# Altium footprint library Custom_Library.PcbLib: 221 footprints (part 9 of 14)
Each footprint in its own frame and in the unit in brackets; x right, y up, seen from the top. Pads: shape width x height; smd on the part's side, far side on the other; paste and mask are expansions set on the pad; w line width, h text height; cw(c..) or ccw(c..) is an arc to the next point about the centre after c.
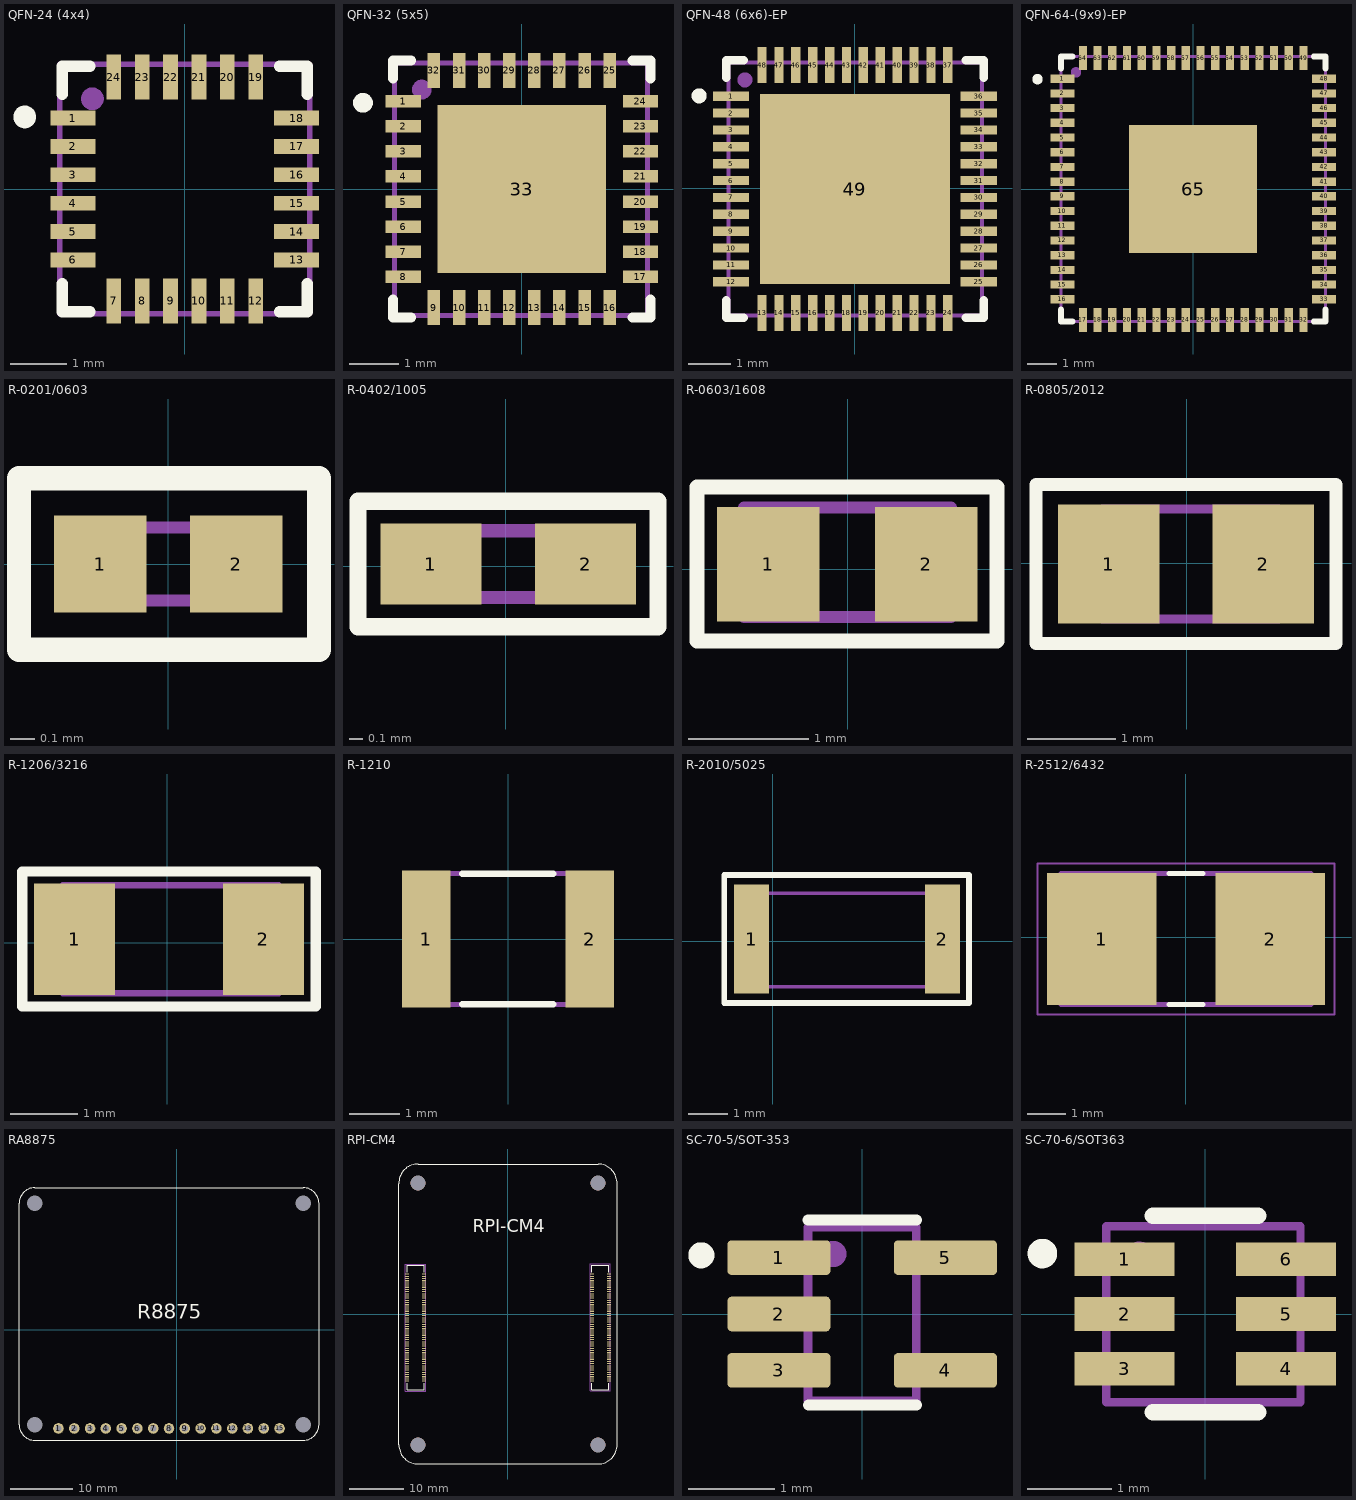
[diagram p8: the footprints below, top view; thin cyan lines are the x and y axes]

## QFN-24 (4x4) [mm]
pads (24):
  rect 0.79x0.26 smd: 1(-1.97,1.25) 2(-1.97,0.75) 3(-1.97,0.25) 4(-1.97,-0.25) 5(-1.97,-0.75) 6(-1.97,-1.25) 13(1.97,-1.25) 14(1.97,-0.75) 15(1.97,-0.25) 16(1.97,0.25) 17(1.97,0.75) 18(1.97,1.25)
  rect 0.26x0.79 smd: 7(-1.25,-1.97) 8(-0.75,-1.97) 9(-0.25,-1.97) 10(0.25,-1.97) 11(0.75,-1.97) 12(1.25,-1.97) 19(1.25,1.97) 20(0.75,1.97) 21(0.25,1.97) 22(-0.25,1.97) 23(-0.75,1.97) 24(-1.25,1.97)
Top Overlay:
  circle w0.2: c-2.819,1.27 r0.1
  lines w0.2: -2.159,-1.669 -2.159,-2.159 -1.669,-2.159 ; -2.159,1.669 -2.159,2.159 -1.669,2.159 ; 1.669,-2.159 2.159,-2.159 2.159,-1.669 ; 1.669,2.159 2.159,2.159 2.159,1.669
Top Assembly:
  circle w0.2: c-1.626,1.589 r0.1
  lines w0.1: -2.2,-2.2 -2.2,2.2 2.2,2.2 2.2,-2.2 -2.2,-2.2
  text "'.Designator'" at -3,-3.649 h1.27

## QFN-32 (5x5) [mil]
pads (33):
  rect 28x10 smd: 1(-94.5,70) 2(-94.5,50) 3(-94.5,30) 4(-94.5,10) 5(-94.5,-10) 6(-94.5,-30) 7(-94.5,-50) 8(-94.5,-70) 17(94.5,-70) 18(94.5,-50) 19(94.5,-30) 20(94.5,-10) 21(94.5,10) 22(94.5,30) 23(94.5,50) 24(94.5,70)
  rect 10x28 smd: 9(-70,-94.5) 10(-50,-94.5) 11(-30,-94.5) 12(-10,-94.5) 13(10,-94.5) 14(30,-94.5) 15(50,-94.5) 16(70,-94.5) 25(70,94.5) 26(50,94.5) 27(30,94.5) 28(10,94.5) 29(-10,94.5) 30(-30,94.5) 31(-50,94.5) 32(-70,94.5)
  rect 134x134 smd: 33(0,0)
Top Overlay:
  circle w7.87: c-126.56,68.63 r3.94
  lines w7.87: -102.5,-88.1 -102.5,-102.5 -88.1,-102.5 ; -102.5,88.1 -102.5,102.5 -88.1,102.5 ; 88.1,-102.5 102.5,-102.5 102.5,-88.1 ; 88.1,102.5 102.5,102.5 102.5,88.1
Top Paste:
  drawing of 25 lines, arcs and shapes, not listed
Top Solder:
  region: -69.5,54.37 -69.5,69.5 69.5,69.5 69.5,54.37
  region: -69.5,23.37 -69.5,38.63 69.5,38.63 69.5,23.37
  region: -69.5,-7.63 -69.5,7.63 69.5,7.63 69.5,-7.63
  region: -69.5,-38.63 -69.5,-23.37 69.5,-23.37 69.5,-38.63
  region: -69.5,-69.5 -69.5,-54.37 69.5,-54.37 69.5,-69.5
  region: -69.5,-69.5 -69.5,69.5 -54.37,69.5 -54.37,-69.5
  region: -23.37,-69.5 -23.37,69.5 -38.63,69.5 -38.63,-69.5
  region: 7.63,-69.5 7.63,69.5 -7.63,69.5 -7.63,-69.5
  region: 38.63,-69.5 38.63,69.5 23.37,69.5 23.37,-69.5
  region: 54.37,-69.5 54.37,69.5 69.5,69.5 69.5,-69.5
Top Assembly:
  circle w7.87: c-79.65,79.2 r3.94
  lines w3.94: -101.44,-100.63 100.04,-100.63 100.04,100.5 -81.44,100.5 -101.44,100.5 -101.44,-100.63
  text "'.Designator'" at -143.69,-169.24 h50
3D body: height 10, standoff 0, extent 0,0 10,10
3D body "QFN32_5X5MC_MCH.step": height 55.12, standoff 0, extent -100.51,-100.51 100.51,100.51

## QFN-48 (6x6)-EP [mm]
pads (49):
  rect 0.86x0.22 smd: 1(-2.936,2.183) 2(-2.936,1.783) 3(-2.936,1.383) 4(-2.936,0.983) 5(-2.936,0.583) 6(-2.936,0.183) 7(-2.936,-0.217) 8(-2.936,-0.617) 9(-2.936,-1.017) 10(-2.936,-1.417) 11(-2.936,-1.817) 12(-2.936,-2.217) 25(2.934,-2.217) 26(2.934,-1.817) 27(2.934,-1.417) 28(2.934,-1.017) 29(2.934,-0.617) 30(2.934,-0.217) 31(2.934,0.183) 32(2.934,0.583) 33(2.934,0.983) 34(2.934,1.383) 35(2.934,1.783) 36(2.934,2.183)
  rect 0.22x0.86 smd: 13(-2.201,-2.952) 14(-1.801,-2.952) 15(-1.401,-2.952) 16(-1.001,-2.952) 17(-0.601,-2.952) 18(-0.201,-2.952) 19(0.199,-2.952) 20(0.599,-2.952) 21(0.999,-2.952) 22(1.399,-2.952) 23(1.799,-2.952) 24(2.199,-2.952) 37(2.199,2.918) 38(1.799,2.918) 39(1.399,2.918) 40(0.999,2.918) 41(0.599,2.918) 42(0.199,2.918) 43(-0.201,2.918) 44(-0.601,2.918) 45(-1.001,2.918) 46(-1.401,2.918) 47(-1.801,2.918) 48(-2.201,2.918)
  rect 4.5x4.5 smd paste-3 mask+0.102: 49(-0.001,-0.017)
Top Overlay:
  circle w0.254: c-3.693,2.189 r0.049
  lines w0.2: -3.051,-2.647 -3.051,-3.067 -2.631,-3.067 ; -3.051,2.613 -3.051,3.033 -2.631,3.033 ; 2.629,-3.067 3.049,-3.067 3.049,-2.647 ; 2.629,3.033 3.049,3.033 3.049,2.613
Top Paste:
  region: 1.879,-1.897 0.419,-1.897 0.419,-0.437 1.879,-0.437
  region: -0.421,-1.897 -1.881,-1.897 -1.881,-0.437 -0.421,-0.437
  region: 1.879,0.403 0.419,0.403 0.419,1.863 1.879,1.863
  region: -0.421,0.403 -1.881,0.403 -1.881,1.863 -0.421,1.863
Top Assembly:
  circle w0.254: c-2.606,2.567 r0.049
  lines w0.1: -2.997,-3.016 2.44,-3.016 3.006,-3.016 3.006,1.461 3.006,2.98 -2.473,2.98 -2.997,2.98 -2.997,-0.61 -2.997,-3.016
  text "'.Designator'" at -3.037,-4.648 h1.27
3D body "P9242-RNDGI8.STEP": height 0.95, standoff -0.05, extent -3.001,-3.017 2.999,2.983

## QFN-64-(9x9)-EP [mm]
pads (65):
  rect 0.81x0.28 smd: 1(-4.45,3.75) 2(-4.45,3.25) 3(-4.45,2.75) 4(-4.45,2.25) 5(-4.45,1.75) 6(-4.45,1.25) 7(-4.45,0.75) 8(-4.45,0.25) 9(-4.45,-0.25) 10(-4.45,-0.75) 11(-4.45,-1.25) 12(-4.45,-1.75) 13(-4.45,-2.25) 14(-4.45,-2.75) 15(-4.45,-3.25) 16(-4.45,-3.75) 33(4.45,-3.75) 34(4.45,-3.25) 35(4.45,-2.75) 36(4.45,-2.25) 37(4.45,-1.75) 38(4.45,-1.25) 39(4.45,-0.75) 40(4.45,-0.25) 41(4.45,0.25) 42(4.45,0.75) 43(4.45,1.25) 44(4.45,1.75) 45(4.45,2.25) 46(4.45,2.75) 47(4.45,3.25) 48(4.45,3.75)
  rect 0.28x0.81 smd: 17(-3.75,-4.45) 18(-3.25,-4.45) 19(-2.75,-4.45) 20(-2.25,-4.45) 21(-1.75,-4.45) 22(-1.25,-4.45) 23(-0.75,-4.45) 24(-0.25,-4.45) 25(0.25,-4.45) 26(0.75,-4.45) 27(1.25,-4.45) 28(1.75,-4.45) 29(2.25,-4.45) 30(2.75,-4.45) 31(3.25,-4.45) 32(3.75,-4.45) 49(3.75,4.45) 50(3.25,4.45) 51(2.75,4.45) 52(2.25,4.45) 53(1.75,4.45) 54(1.25,4.45) 55(0.75,4.45) 56(0.25,4.45) 57(-0.25,4.45) 58(-0.75,4.45) 59(-1.25,4.45) 60(-1.75,4.45) 61(-2.25,4.45) 62(-2.75,4.45) 63(-3.25,4.45) 64(-3.75,4.45)
  rect 4.35x4.35 smd paste-3: 65(0,0)
Top Overlay:
  circle w0.254: c-5.296,3.734 r0.049
  lines w0.2: -4.5,-4.1 -4.5,-4.5 -4.1,-4.5 ; -4.5,4.1 -4.5,4.5 -4.1,4.5 ; 4.1,-4.5 4.5,-4.5 4.5,-4.1 ; 4.1,4.5 4.5,4.5 4.5,4.1
Top Paste:
  region: 1.375,-1.375 -1.375,-1.375 -1.375,1.375 1.375,1.375
Top Assembly:
  circle w0.254: c-3.986,3.966 r0.049
  lines w0.1: -4.5,-4.5 -4.5,4.5 4.5,4.5 4.5,-4.5 -4.5,-4.5
  text "'.Designator'" at -3.305,-6.268 h1.27
3D body "QFN_32HQ-REEL_FTD.step": height 0.89, standoff 0, extent -4.496,-4.496 4.496,4.496

## R-0201/0603 [mm]
pads (2):
  rect 0.38x0.4 smd: 1(-0.28,0) 2(0.28,0)
Top Overlay:
  lines w0.1: -0.614,-0.353 0.621,-0.353 0.621,0.353 -0.614,0.353 -0.614,-0.353
Top Assembly:
  lines w0.05: -0.302,-0.151 0.3,-0.151 0.3,0.151 -0.302,0.151 -0.302,-0.151
  text "'.Designator'" at -3.161,-1.371 h1.27
3D body "R0201_020.STEP": height 0.2, standoff 0, extent -0.295,-0.148 0.305,0.152

## R-0402/1005 [mm]
height 1.3
pads (2):
  rect 0.75x0.6 smd: 1(-0.556,0.014) 2(0.594,0.014)
Top Overlay:
  lines w0.127: -1.096,-0.451 -1.096,0.481 1.13,0.481 1.13,-0.451 -1.096,-0.451
Top Assembly:
  lines w0.1: -0.484,-0.234 -0.484,0.263 0.518,0.263 0.518,-0.234 -0.484,-0.234
  text "'.Designator'" at -3.3,-1.6 h1.27
3D body "0402 resistor.STEP": height 0.35, standoff 0, extent -0.482,-0.237 0.518,0.263

## R-0603/1608 [mm] "Chip Resistor, 2-Leads, Body 1.60x0.80mm, IPC Medium Density"
height 0.45
pads (2):
  rect 0.85x0.95 smd: 1(-0.659,0.042) 2(0.651,0.042)
Top Overlay:
  lines w0.127: -1.249,-0.594 -1.249,0.682 1.239,0.682 1.239,-0.594 -1.249,-0.594
Top Assembly:
  lines w0.1: -0.86,-0.394 0.858,-0.394 0.858,0.512 -0.801,0.512 -0.86,0.512 -0.86,-0.394
  text "'.Designator'" at -3.112,-1.801 h1.27
3D body "0603 resistor.STEP": height 0.45, standoff 0, extent -0.799,-0.348 0.801,0.452

## R-0805/2012 [mm] "Chip Capacitor, 2-Leads, Body 2.00x1.20mm, IPC Medium Density"
height 1.15
pads (2):
  rect 1.15x1.35 smd: 1(-0.883,-0.009) 2(0.867,-0.009)
Top Overlay:
  lines w0.15: -1.708,-0.909 -1.708,-0.709 -1.708,0.891 1.692,0.891 1.692,0.691 1.692,-0.909 -1.708,-0.909
Top Assembly:
  lines w0.1: -0.958,-0.634 -0.958,0.616 1.042,0.616 1.042,-0.634 -0.958,-0.634
  text "'.Designator'" at 1.067,-0.924 h1.27
3D body "RESC-0805.stp": height 0.6, standoff 0, extent -1.05,-0.675 1.05,0.675

## R-1206/3216 [mm] "Chip Capacitor, 2-Leads, Body 3.25x1.60mm, IPC Medium Density"
height 1.6
pads (2):
  rect 1.2x1.65 smd: 1(-1.373,0.055) 2(1.427,0.055)
Top Overlay:
  lines w0.15: -2.15,-0.94 2.203,-0.94 2.203,1.058 -2.15,1.058 -2.15,0.714 -2.15,-0.94
Top Assembly:
  lines w0.1: -1.548,-0.745 1.652,-0.745 1.652,0.855 -1.548,0.855 -1.548,-0.745
  text "'.Designator'" at -3.2,1.45 h1.27
3D body "Resistor_SMD_0,25W_1206.stp": height 0.85, standoff 0, extent -1.583,-0.759 1.617,0.841

## R-1210 [mm]
pads (2):
  rect 0.96x2.72 smd: 1(-1.625,0) 2(1.625,0)
Top Overlay:
  lines w0.127: -0.914,-1.3 0.599,-1.3 0.9,-1.3 ; -0.914,1.3 0.9,1.3
Top Assembly:
  lines w0.1: -1.7,-1.3 -1.7,1.3 -1,1.3 1.7,1.3 1.7,-1.3 -1.7,-1.3
  text "'.Designator'" at -3.356,-2.788 h1.27
3D body: height 1, standoff 0, extent -1.7,-1.3 1.7,1.3

## R-2010/5025 [mm]
pads (2):
  rect 0.9x2.8 smd: 1(-0.55,0.05) 2(4.35,0.05)
Top Overlay:
  lines w0.15: -1.25,-1.59 -1.25,0.95 -1.25,1.7 3.81,1.7 5.03,1.7 5.03,-1.46 5.03,-1.59 3.82,-1.59 0,-1.59 -1.25,-1.59
Top Assembly:
  lines w0.1: -0.55,-1.17 -0.55,1.23 4.35,1.23 4.35,-1.17 -0.55,-1.17
  text "'.Designator'" at 0.665,-0.45 h1.27
3D body "RES2010.stp": height 0.55, standoff 0, extent -0.55,-1.17 4.35,1.23

## R-2512/6432 [mm]
pads (2):
  rect 2.84x3.42 smd: 1(-2.189,-0.049) 2(2.191,-0.049)
Top Overlay:
  lines w0.127: -0.449,-1.749 0.451,-1.749 ; -0.449,1.651 0.451,1.651
Mechanical 13:
  lines w0.127: -3.249,-1.749 3.251,-1.749 3.251,1.651 -3.249,1.651 -3.249,-1.749
Mechanical 15:
  lines w0.05: -3.857,-2.007 3.859,-2.007 3.859,1.909 -3.857,1.909 -3.857,-2.007
3D body "RHC2512FT2R49.STEP": height 0.7, standoff 0, extent -3.175,-1.575 3.175,1.575

## RA8875 [mm]
pads (19):
  round 1.7 hole 1 mask+0.1: 1(-19.05,-15.875) 2(-16.51,-15.875) 3(-13.97,-15.875) 4(-11.43,-15.875) 5(-8.89,-15.875) 6(-6.35,-15.875) 7(-3.81,-15.875) 8(-1.27,-15.875) 9(1.27,-15.875) 10(3.81,-15.875) 11(6.35,-15.875) 12(8.89,-15.875) 13(11.43,-15.875) 14(13.97,-15.875) 15(16.51,-15.875)
  round 1.7 hole 2.5 mask+0.05: none(-22.86,-15.24) none(-22.86,20.32) none(20.32,-15.24) none(20.32,20.32)
Top Overlay:
  lines w0.2: -25.4,-15.24 ccw(c-22.86,-15.24) -22.86,-17.78 20.32,-17.78 ccw(c20.32,-15.24) 22.86,-15.24 22.86,20.32 ccw(c20.32,20.32) 20.32,22.86 -22.86,22.86 ccw(c-22.86,20.32) -25.4,20.32 -25.4,-15.24
  text "R8875" at -6.402,0.997 h4

## RPI-CM4 [mm]
pads (204):
  rect 0.7x0.2 smd mask+0.07: 1(-18.5,7.3) 2(-15.42,7.3) 3(-18.5,6.9) 4(-15.42,6.9) 5(-18.5,6.5) 6(-15.42,6.5) 7(-18.5,6.1) 8(-15.42,6.1) 9(-18.5,5.7) 10(-15.42,5.7) 11(-18.5,5.3) 12(-15.42,5.3) 13(-18.5,4.9) 14(-15.42,4.9) 15(-18.5,4.5) 16(-15.42,4.5) 17(-18.5,4.1) 18(-15.42,4.1) 19(-18.5,3.7) 20(-15.42,3.7) 21(-18.5,3.3) 22(-15.42,3.3) 23(-18.5,2.9) 24(-15.42,2.9) 25(-18.5,2.5) 26(-15.42,2.5) 27(-18.5,2.1) 28(-15.42,2.1) 29(-18.5,1.7) 30(-15.42,1.7) 31(-18.5,1.3) 32(-15.42,1.3) 33(-18.5,0.9) 34(-15.42,0.9) 35(-18.5,0.5) 36(-15.42,0.5) 37(-18.5,0.1) 38(-15.42,0.1) 39(-18.5,-0.3) 40(-15.42,-0.3) 41(-18.5,-0.7) 42(-15.42,-0.7) 43(-18.5,-1.1) 44(-15.42,-1.1) 45(-18.5,-1.5) 46(-15.42,-1.5) 47(-18.5,-1.9) 48(-15.42,-1.9) 49(-18.5,-2.3) 50(-15.42,-2.3) 51(-18.5,-2.7) 52(-15.42,-2.7) 53(-18.5,-3.1) 54(-15.42,-3.1) 55(-18.5,-3.5) 56(-15.42,-3.5) 57(-18.5,-3.9) 58(-15.42,-3.9) 59(-18.5,-4.3) 60(-15.42,-4.3) 61(-18.5,-4.7) 62(-15.42,-4.7) 63(-18.5,-5.1) 64(-15.42,-5.1) 65(-18.5,-5.5) 66(-15.42,-5.5) 67(-18.5,-5.9) 68(-15.42,-5.9) 69(-18.5,-6.3) 70(-15.42,-6.3) 71(-18.5,-6.7) 72(-15.42,-6.7) 73(-18.5,-7.1) 74(-15.42,-7.1) 75(-18.5,-7.5) 76(-15.42,-7.5) 77(-18.5,-7.9) 78(-15.42,-7.9) 79(-18.5,-8.3) 80(-15.42,-8.3) 81(-18.5,-8.7) 82(-15.42,-8.7) 83(-18.5,-9.1) 84(-15.42,-9.1) 85(-18.5,-9.5) 86(-15.42,-9.5) 87(-18.5,-9.9) 88(-15.42,-9.9) 89(-18.5,-10.3) 90(-15.42,-10.3) 91(-18.5,-10.7) 92(-15.42,-10.7) 93(-18.5,-11.1) 94(-15.42,-11.1) 95(-18.5,-11.5) 96(-15.42,-11.5) 97(-18.5,-11.9) 98(-15.42,-11.9) 99(-18.5,-12.3) 100(-15.42,-12.3) 101(15.42,7.3) 102(18.5,7.3) 103(15.42,6.9) 104(18.5,6.9) 105(15.42,6.5) 106(18.5,6.5) 107(15.42,6.1) 108(18.5,6.1) 109(15.42,5.7) 110(18.5,5.7) 111(15.42,5.3) 112(18.5,5.3) 113(15.42,4.9) 114(18.5,4.9) 115(15.42,4.5) 116(18.5,4.5) 117(15.42,4.1) 118(18.5,4.1) 119(15.42,3.7) 120(18.5,3.7) 121(15.42,3.3) 122(18.5,3.3) 123(15.42,2.9) 124(18.5,2.9) 125(15.42,2.5) 126(18.5,2.5) 127(15.42,2.1) 128(18.5,2.1) 129(15.42,1.7) 130(18.5,1.7) 131(15.42,1.3) 132(18.5,1.3) 133(15.42,0.9) 134(18.5,0.9) 135(15.42,0.5) 136(18.5,0.5) 137(15.42,0.1) 138(18.5,0.1) 139(15.42,-0.3) 140(18.5,-0.3) 141(15.42,-0.7) 142(18.5,-0.7) 143(15.42,-1.1) 144(18.5,-1.1) 145(15.42,-1.5) 146(18.5,-1.5) 147(15.42,-1.9) 148(18.5,-1.9) 149(15.42,-2.3) 150(18.5,-2.3) 151(15.42,-2.7) 152(18.5,-2.7) 153(15.42,-3.1) 154(18.5,-3.1) 155(15.42,-3.5) 156(18.5,-3.5) 157(15.42,-3.9) 158(18.5,-3.9) 159(15.42,-4.3) 160(18.5,-4.3) 161(15.42,-4.7) 162(18.5,-4.7) 163(15.42,-5.1) 164(18.5,-5.1) 165(15.42,-5.5) 166(18.5,-5.5) 167(15.42,-5.9) 168(18.5,-5.9) 169(15.42,-6.3) 170(18.5,-6.3) 171(15.42,-6.7) 172(18.5,-6.7) 173(15.42,-7.1) 174(18.5,-7.1) 175(15.42,-7.5) 176(18.5,-7.5) 177(15.42,-7.9) 178(18.5,-7.9) 179(15.42,-8.3) 180(18.5,-8.3) 181(15.42,-8.7) 182(18.5,-8.7) 183(15.42,-9.1) 184(18.5,-9.1) 185(15.42,-9.5) 186(18.5,-9.5) 187(15.42,-9.9) 188(18.5,-9.9) 189(15.42,-10.3) 190(18.5,-10.3) 191(15.42,-10.7) 192(18.5,-10.7) 193(15.42,-11.1) 194(18.5,-11.1) 195(15.42,-11.5) 196(18.5,-11.5) 197(15.42,-11.9) 198(18.5,-11.9) 199(15.42,-12.3) 200(18.5,-12.3)
  round 2.7 hole 2.7 unplated mask+1.7: none(-16.5,-24) none(-16.5,24) none(16.5,-24) none(16.5,24)
Top Overlay:
  lines w0.2: -20.001,-23.994 ccw(c-16.5,-24) -16.451,-27.501 -13.8,-27.5 12.2,-27.5 16.595,-27.5 ; -20,-23.994 -20,-21.3 -20,7.3 -20,15.4 -20,23.919 cw(c-16.5,24) -16.471,27.501 -7.9,27.5 8.4,27.5 16.581,27.5 cw(c16.5,24) 20,23.919 ; -18.5,-12.7 -18.5,-13.9 -15.4,-13.9 -15.4,-12.7 ; -18.5,7.7 -18.5,8.9 -15.4,8.9 -15.4,7.7 ; 15.4,-12.7 15.4,-13.9 18.5,-13.9 18.5,-12.7 ; 15.4,7.7 15.4,8.9 18.5,8.9 18.5,7.7 ; 16.595,-27.5 ccw(c16.5,-24) 20.001,-24 ; 20,-24 20,-19.7 20,15.9 20,24
  text "RPI-CM4" at -6.5,14.143 h4
Top Assembly:
  lines w0.11: -18.81,-14.19 -15.07,-14.19 -15.07,9.13 -18.59,9.13 -18.81,9.13 -18.81,-14.19 ; 15.042,-14.105 18.782,-14.105 18.782,9.215 15.262,9.215 15.042,9.215 15.042,-14.105
  text "'.Designator'" at -8.2,-6.7 h3
3D body "xxxxxx.STEP": height 1.43, standoff -0.02, extent 15.263,-13.799 18.643,8.801
3D body "xxxxxx.STEP": height 1.43, standoff -0.02, extent -18.633,-13.8 -15.253,8.8

## SC-70-5/SOT-353 [mm]
pads (5):
  rrect25% 1.19x0.4 smd: 1(-0.96,0.65) 2(-0.96,0) 3(-0.96,-0.65) 4(0.96,-0.65) 5(0.96,0.65)
Top Overlay:
  circle w0.2: c-1.854,0.677 r0.05
  lines w0.127: -0.626,1.083 0.624,1.083 ; -0.621,-1.047 0.629,-1.047
Top Assembly:
  circle w0.2: c-0.332,0.692 r0.05
  lines w0.1: -0.625,-1 -0.625,1 0.625,1 0.625,-1 -0.625,-1
  text "'.Designator'" at -3.069,-2.081 h1.27
3D body "SN74LV1T125DCKR.STEP": height 1.1, standoff 0, extent -1.05,-1 1.05,1

## SC-70-6/SOT363 [mm]
pads (6):
  rect 1.19x0.4 smd: 1(-0.96,0.65) 2(-0.96,0) 3(-0.96,-0.65) 4(0.96,-0.65) 5(0.96,0) 6(0.96,0.65)
Top Overlay:
  circle w0.2: c-1.94,0.719 r0.076
  lines w0.2: -0.625,-1.17 0.625,-1.17 ; -0.625,1.17 0.625,1.17
Top Assembly:
  circle w0.2: c-0.785,0.685 r0.076
  lines w0.1: -1.18,-1.053 0.829,-1.053 1.133,-1.053 1.133,0.185 1.133,1.045 -1.18,1.045 -1.18,-0.382 -1.18,-1.053
  text "'.Designator'" at -3.225,-2.273 h1.27
3D body "User Library-sot363.STEP": height 1, standoff 0, extent -1.15,-1.05 1.15,1.05